# Altium footprint library Connectors THD.PcbLib: 631 footprints (part 14 of 46) (continued)
## FCI_HM2P07PDG1A1N9LF [mm] "110+44 Contacts, 22 positions  in Two Parts x 5 Rows  (a,b,c,d,e) + 2  Rows (z,f), Pitch 2 mm,  Press-Fit, Straight Hard Metric Male Connector, Millipacs, Type A"
height 13.6
pads (155):
  round 1.1 hole 0.6: a1(-4,24) a2(-4,22) a3(-4,20) a4(-4,18) a5(-4,16) a6(-4,14) a7(-4,12) a8(-4,10) a9(-4,8) a10(-4,6) a11(-4,4) a15(-4,-4) a16(-4,-6) a17(-4,-8) a18(-4,-10) a19(-4,-12) a20(-4,-14) a21(-4,-16) a22(-4,-18) a23(-4,-20) a24(-4,-22) a25(-4,-24) b1(-2,24) b2(-2,22) b3(-2,20) b4(-2,18) b5(-2,16) b6(-2,14) b7(-2,12) b8(-2,10) b9(-2,8) b10(-2,6) b11(-2,4) b15(-2,-4) b16(-2,-6) b17(-2,-8) b18(-2,-10) b19(-2,-12) b20(-2,-14) b21(-2,-16) b22(-2,-18) b23(-2,-20) b24(-2,-22) b25(-2,-24) c1(0,24) c2(0,22) c3(0,20) c4(0,18) c5(0,16) c6(0,14) c7(0,12) c8(0,10) c9(0,8) c10(0,6) c11(0,4) c15(0,-4) c16(0,-6) c17(0,-8) c18(0,-10) c19(0,-12) c20(0,-14) c21(0,-16) c22(0,-18) c23(0,-20) c24(0,-22) c25(0,-24) d1(2,24) d2(2,22) d3(2,20) d4(2,18) d5(2,16) d6(2,14) d7(2,12) d8(2,10) d9(2,8) d10(2,6) d11(2,4) d15(2,-4) d16(2,-6) d17(2,-8) d18(2,-10) d19(2,-12) d20(2,-14) d21(2,-16) d22(2,-18) d23(2,-20) d24(2,-22) d25(2,-24) e1(4,24) e2(4,22) e3(4,20) e4(4,18) e5(4,16) e6(4,14) e7(4,12) e8(4,10) e9(4,8) e10(4,6) e11(4,4) e15(4,-4) e16(4,-6) e17(4,-8) e18(4,-10) e19(4,-12) e20(4,-14) e21(4,-16) e22(4,-18) e23(4,-20) e24(4,-22) e25(4,-24) f1(6,24) f2(6,22) f3(6,20) f4(6,18) f5(6,16) f6(6,14) f7(6,12) f8(6,10) f9(6,8) f10(6,6) f11(6,4) f15(6,-4) f16(6,-6) f17(6,-8) f18(6,-10) f19(6,-12) f20(6,-14) f21(6,-16) f22(6,-18) f23(6,-20) f24(6,-22) f25(6,-24) z1(-6,24) z2(-6,22) z3(-6,20) z4(-6,18) z5(-6,16) z6(-6,14) z7(-6,12) z8(-6,10) z9(-6,8) z10(-6,6) z11(-6,4) z15(-6,-4) z16(-6,-6) z17(-6,-8) z18(-6,-10) z19(-6,-12) z20(-6,-14) z21(-6,-16) z22(-6,-18) z23(-6,-20) z24(-6,-21.998) z25(-6,-24)
  round 1 hole 2 unplated mask+0.6: MECH1(2,0)
Top Overlay:
  lines w0.2: -7.25,-25.4 -7.25,24.5 ; -6.9,24.55 -6.9,-25.4 ; -5.85,-3 -3.6,-3 -3.6,-2.9 ; -5.85,3 -3.6,3 -3.6,2.9 ; -3.6,-1.9 -2.25,-1.9 -2.25,-2.9 ; -3.6,1.9 -2.25,1.9 -2.25,2.9 ; 2.25,-2.9 2.25,-1.9 3.6,-1.9 ; 2.25,2.9 2.25,1.9 3.6,1.9 ; 5.85,-3 3.6,-3 3.6,-2.9 ; 5.85,3 3.6,3 3.6,2.9 ; 7.25,-25.4 7.25,24.5 ; -6.9,-25.4 -7.7,-25.4 -7.7,24.5 -6.95,24.5 -6.45,25 6.45,25 6.95,24.5 ; -6.9,-25.4 -6.5,-25 6.55,-25 6.95,-25.4 ; -3.6,-2.9 3.6,-2.9 ; -3.6,-2.9 -3.6,-1.731 -3.95,-1.125 -3.95,1.125 -3.6,1.731 -3.6,2.9 ; -3.6,2.9 3.6,2.9 ; 3.6,-2.9 3.6,-1.9 ; 3.6,-1.9 3.6,-1.731 3.95,-1.125 3.95,1.125 3.6,1.731 3.6,2.9 ; 6.95,-25.4 7.7,-25.4 7.7,24.5 6.95,24.5 ; 6.95,-25.4 6.95,24.5 ; -6.2,-1.9 -6.2,1.9 -4.475,1.9 -4.475,-1.9 -6.2,-1.9 ; 4.475,-1.9 4.475,1.9 6.2,1.9 6.2,-1.9 4.475,-1.9
  text "25" at -10.1,-24.661 h1.2
  text "a" at -4.333,25.517 h1.5
  text "b" at -2.333,25.5 h1.5
  text "c" at -0.333,25.517 h1.5
  text "d" at 1.667,25.5 h1.5
  text "e" at 3.692,25.517 h1.5
  text "f" at 5.637,25.5 h1.5
  text "z" at -6.363,25.525 h1.5
  text "11" at -9.525,3.342 h1.2
  text "1" at -8.45,23.475 h1.2
  text "22" at -10.1,-18.661 h1.2
  text "15" at -9.925,-4.558 h1.2
Mechanical 8:
  drawing of 624 lines, arcs and shapes, not listed
Mechanical 14:
  drawing of 798 lines, arcs and shapes, not listed
  text "25" at -10.1,-24.661 h1.2
  text "a" at -4.333,25.517 h1.5
  text "b" at -2.333,25.5 h1.5
  text "c" at -0.333,25.517 h1.5
  text "d" at 1.667,25.5 h1.5
  text "e" at 3.692,25.517 h1.5
  text "f" at 5.637,25.5 h1.5
  text "z" at -6.363,25.525 h1.5
  text "1" at -8.45,23.475 h1.2
  text "11" at -9.525,3.342 h1.2
  text "22" at -10.1,-18.661 h1.2
  text "15" at -9.925,-4.558 h1.2
Drill Drawing:
  lines w0.1: -6.9,-18.7 -6.9,-25 6.9,-25 6.9,-3 0,-3 0,3 6.9,3 6.9,25 -6.9,25 -6.9,19.6
  text "PRESS-FIT TECHNOLOGY diam. 0.6mm +0.05 -0" at -7.3,-17.975 h1
3D body: height 13.45, standoff -3.3, extent -7.7,-25.4 7.7,25

## FCI_HM2P70PDE121N9LF [mm] "110+44 Contacts, 22 positions x 5 Rows  (a,b,c,d,e) + 2  Rows (z,f), Pitch 2 mm,  Press-Fit, Straight Hard Metric Male Connector, Millipacs, Type B22"
height 13.6
pads (154):
  round 1.1 hole 0.6: a1(-4,21) a2(-4,19) a3(-4,17) a4(-4,15) a5(-4,13) a6(-4,11) a7(-4,9) a8(-4,7) a9(-4,5) a10(-4,3) a11(-4,1) a12(-4,-1) a13(-4,-3) a14(-4,-5) a15(-4,-7) a16(-4,-9) a17(-4,-11) a18(-4,-13) a19(-4,-15) a20(-4,-17) a21(-4,-19) a22(-4,-21) b1(-2,21) b2(-2,19) b3(-2,17) b4(-2,15) b5(-2,13) b6(-2,11) b7(-2,9) b8(-2,7) b9(-2,5) b10(-2,3) b11(-2,1) b12(-2,-1) b13(-2,-3) b14(-2,-5) b15(-2,-7) b16(-2,-9) b17(-2,-11) b18(-2,-13) b19(-2,-15) b20(-2,-17) b21(-2,-19) b22(-2,-21) c1(0,21) c2(0,19) c3(0,17) c4(0,15) c5(0,13) c6(0,11) c7(0,9) c8(0,7) c9(0,5) c10(0,3) c11(0,1) c12(0,-1) c13(0,-3) c14(0,-5) c15(0,-7) c16(0,-9) c17(0,-11) c18(0,-13) c19(0,-15) c20(0,-17) c21(0,-19) c22(0,-21) d1(2,21) d2(2,19) d3(2,17) d4(2,15) d5(2,13) d6(2,11) d7(2,9) d8(2,7) d9(2,5) d10(2,3) d11(2,1) d12(2,-1) d13(2,-3) d14(2,-5) d15(2,-7) d16(2,-9) d17(2,-11) d18(2,-13) d19(2,-15) d20(2,-17) d21(2,-19) d22(2,-21) e1(4,21) e2(4,19) e3(4,17) e4(4,15) e5(4,13) e6(4,11) e7(4,9) e8(4,7) e9(4,5) e10(4,3) e11(4,1) e12(4,-1) e13(4,-3) e14(4,-5) e15(4,-7) e16(4,-9) e17(4,-11) e18(4,-13) e19(4,-15) e20(4,-17) e21(4,-19) e22(4,-21) f1(6,21) f2(6,19) f3(6,17) f4(6,15) f5(6,13) f6(6,11) f7(6,9) f8(6,7) f9(6,5) f10(6,3) f11(6,1) f12(6,-0.998) f13(6,-3) f14(6,-4.998) f15(6,-7) f16(6,-9) f17(6,-11) f18(6,-13) f19(6,-15) f20(6,-17) f21(6,-19) f22(6,-21) z1(-6,21) z2(-6,19) z3(-6,17) z4(-6,15) z5(-6,13) z6(-6,11) z7(-6,9) z8(-6,7) z9(-6,5) z10(-6,3) z11(-6,1) z12(-6,-1) z13(-6,-3) z14(-6,-5) z15(-6,-7) z16(-6,-9) z17(-6,-11) z18(-6,-13) z19(-6,-15) z20(-6,-17) z21(-6,-19) z22(-6,-21)
Top Overlay:
  lines w0.2: -7.25,-22.4 -7.25,21.5 ; -6.95,-22.4 -6.95,21.5 ; -6.9,21.55 -6.9,-22.4 ; 6.9,21.55 6.9,-22.4 ; 6.95,-22.4 6.95,21.5 ; 7.25,-22.4 7.25,21.5 ; -6.95,21.5 -6.45,22 6.45,22 6.95,21.5 ; -6.95,21.5 -7.7,21.5 -7.7,-22.4 -6.9,-22.4 ; -6.9,-22.4 -6.5,-22 6.5,-22 6.9,-22.4 ; 6.9,-22.4 7.7,-22.4 7.7,21.5 6.95,21.5
  text "15" at -9.925,-7.558 h1.2
  text "22" at -10.1,-21.661 h1.2
  text "1" at -8.45,20.475 h1.2
  text "11" at -9.525,0.342 h1.2
  text "z" at -6.363,22.525 h1.5
  text "f" at 5.637,22.5 h1.5
  text "e" at 3.667,22.517 h1.5
  text "d" at 1.667,22.5 h1.5
  text "c" at -0.333,22.517 h1.5
  text "b" at -2.333,22.5 h1.5
  text "a" at -4.333,22.517 h1.5
Mechanical 8:
  drawing of 620 lines, arcs and shapes, not listed
Mechanical 14:
  drawing of 760 lines, arcs and shapes, not listed
  text "15" at -9.925,-7.558 h1.2
  text "22" at -10.1,-21.661 h1.2
  text "11" at -9.525,0.342 h1.2
  text "1" at -8.45,20.475 h1.2
  text "z" at -6.363,22.525 h1.5
  text "f" at 5.637,22.5 h1.5
  text "e" at 3.667,22.517 h1.5
  text "d" at 1.667,22.5 h1.5
  text "c" at -0.333,22.517 h1.5
  text "b" at -2.333,22.5 h1.5
  text "a" at -4.333,22.517 h1.5
Drill Drawing:
  lines w0.1: -6.9,-18.7 -6.9,-22 6.9,-22 6.9,22 -6.9,22 -6.9,19.7
  text "PRESS-FIT TECHNOLOGY diam. 0.6mm +0.05 -0" at -7.2,-17.775 h1
3D body: height 13.45, standoff -3.3, extent -7.7,-22.4 7.7,22

## FCI_HM2R01PA5108N9LF [mm] "110+13 Contacts, 22 positions x 5 Rows (a,b,c,d,e) in Two Part + Shield  Row (f) 13 Positions, Pitch 2 mm,  Press-Fit, Right Angle Hard Metric Female Connector, Millipacs, Type A"
height 12.25
pads (125):
  round 1.1 hole 0.6: a1(5,24) a2(5,22) a3(5,20) a4(5,18) a5(5,16) a6(5,14) a7(5,12) a8(5,10) a9(5,8) a10(5,6) a11(5,4) a15(5,-4) a16(5,-6) a17(5,-8) a18(5,-10) a19(5,-12) a20(5,-14) a21(5,-16) a22(5,-18) a23(5,-20) a24(5,-22) a25(5,-24) b1(3,24) b2(3,22) b3(3,20) b4(3,18) b5(3,16) b6(3,14) b7(3,12) b8(3,10) b9(3,8) b10(3,6) b11(3,4) b15(3,-4) b16(3,-6) b17(3,-8) b18(3,-10) b19(3,-12) b20(3,-14) b21(3,-16) b22(3,-18) b23(3,-20) b24(3,-22) b25(3,-24) c1(1,24) c2(1,22) c3(1,20) c4(1,18) c5(1,16) c6(1,14) c7(1,12) c8(1,10) c9(1,8) c10(1,6) c11(1,4) c15(1,-4) c16(1,-6) c17(1,-8) c18(1,-10) c19(1,-12) c20(1,-14) c21(1,-16) c22(1,-18) c23(1,-20) c24(1,-22) c25(1,-24) d1(-1,24) d2(-1,22) d3(-1,20) d4(-1,18) d5(-1,16) d6(-1,14) d7(-1,12) d8(-1,10) d9(-1,8) d10(-1,6) d11(-1,4) d15(-1,-4) d16(-1,-6) d17(-1,-8) d18(-1,-10) d19(-1,-12) d20(-1,-14) d21(-1,-16) d22(-1,-18) d23(-1,-20) d24(-1,-22) d25(-1,-24) e1(-3,24) e2(-3,22) e3(-3,20) e4(-3,18) e5(-3,16) e6(-3,14) e7(-3,12) e8(-3,10) e9(-3,8) e10(-3,6) e11(-3,4) e15(-3,-4) e16(-3,-6) e17(-3,-8) e18(-3,-10) e19(-3,-12) e20(-3,-14) e21(-3,-16) e22(-3,-18) e23(-3,-20) e24(-3,-22) e25(-3,-24) f1(-5,24) f3(-5,20) f5(-5,16) f7(-5,12) f9(-5,8) f11(-5,4) f13(-5,0) f15(-5,-4) f17(-5,-8) f19(-5,-12) f21(-5,-16) f23(-5,-20) f25(-5,-24)
  round 1 hole 2 unplated mask+0.6: MECH1(-3,0) MECH2(3,0)
Top Overlay:
  lines w0.2: -5.15,-25 15.8,-25 15.8,-1.825 ; -5.15,-23 -5.15,-21 ; -5.15,-19 -5.15,-17 ; -5.15,-15 -5.15,-13 ; -5.15,-11 -5.15,-9 ; -5.15,-7 -5.15,-5 ; -5.15,-3 -5.15,-1 ; -5.15,1 -5.15,3 ; -5.15,5 -5.15,7 ; -5.15,9 -5.15,11 ; -5.15,13 -5.15,15 ; -5.15,17 -5.15,19 ; -5.15,21 -5.15,23 ; -5.15,25 15.8,25 15.8,1.825 ; 8,-2.464 15.8,-2.464 ; 8,-1.824 17.4,-1.825 18.65,-0.575 18.65,0.575 17.4,1.825 8,1.825 ; 8,2.464 15.8,2.464 ; 15.1,-25 15.1,-3.05 ; 15.1,-23.45 9.65,-23.45 9.65,-22.55 15.1,-22.55 ; 15.1,-21.45 9.65,-21.45 9.65,-20.55 15.1,-20.55 ; 15.1,-19.45 9.65,-19.45 9.65,-18.55 15.1,-18.55 ; 15.1,-17.45 9.65,-17.45 9.65,-16.55 15.1,-16.55 ; 15.1,-15.45 9.65,-15.45 9.65,-14.55 15.1,-14.55 ; 15.1,-13.45 9.65,-13.45 9.65,-12.55 15.1,-12.55 ; 15.1,-11.45 9.65,-11.45 9.65,-10.55 15.1,-10.55 ; 15.1,-9.45 9.65,-9.45 9.65,-8.55 15.1,-8.55 ; 15.1,-7.45 9.65,-7.45 9.65,-6.55 15.1,-6.55 ; 15.1,-5.45 9.65,-5.45 9.65,-4.55 15.1,-4.55 ; 15.1,3.05 15.1,25 ; 15.1,4.55 9.65,4.55 9.65,5.45 15.1,5.45 ; 15.1,6.55 9.65,6.55 9.65,7.45 15.1,7.45 ; 15.1,8.55 9.65,8.55 9.65,9.45 15.1,9.45 ; 15.1,10.55 9.65,10.55 9.65,11.45 15.1,11.45 ; 15.1,12.55 9.65,12.55 9.65,13.45 15.1,13.45 ; 15.1,14.55 9.65,14.55 9.65,15.45 15.1,15.45 ; 15.1,16.55 9.65,16.55 9.65,17.45 15.1,17.45 ; 15.1,18.55 9.65,18.55 9.65,19.45 15.1,19.45 ; 15.1,20.55 9.65,20.55 9.65,21.45 15.1,21.45 ; 15.1,22.55 9.65,22.55 9.65,23.45 15.1,23.45 ; 15.8,-3.05 8,-3.05 8,3.05 15.8,3.05 ; 17.325,-1.825 17.325,1.825 ; 17.75,-1.5 19,-0.25 19,0.25 17.75,1.5
  text "a" at 4.667,25.492 h1.5
  text "e" at -3.333,25.542 h1.5
  text "d" at -1.333,25.5 h1.5
  text "c" at 0.692,25.492 h1.5
  text "b" at 2.667,25.5 h1.5
  text "f" at -5.363,25.5 h1.5
  text "1" at -5.975,23.8 h1.2
  text "11" at -5.975,3.217 h1.2
  text "20" at -5.975,-14.783 h1.2
  text "25" at -5.975,-24.783 h1.2
Mechanical 8:
  drawing of 506 lines, arcs and shapes, not listed
Mechanical 14:
  lines w0.1: 8,-2.464 15.8,-2.464 ; 8,-1.824 17.4,-1.825 18.65,-0.575 18.65,0.575 17.4,1.825 8,1.825 ; 8,2.464 15.8,2.464 ; 15.1,-25 15.1,-3.05 ; 15.1,-23.45 9.65,-23.45 9.65,-22.55 15.1,-22.55 ; 15.1,-21.45 9.65,-21.45 9.65,-20.55 15.1,-20.55 ; 15.1,-19.45 9.65,-19.45 9.65,-18.55 15.1,-18.55 ; 15.1,-17.45 9.65,-17.45 9.65,-16.55 15.1,-16.55 ; 15.1,-15.45 9.65,-15.45 9.65,-14.55 15.1,-14.55 ; 15.1,-13.45 9.65,-13.45 9.65,-12.55 15.1,-12.55 ; 15.1,-11.45 9.65,-11.45 9.65,-10.55 15.1,-10.55 ; 15.1,-9.45 9.65,-9.45 9.65,-8.55 15.1,-8.55 ; 15.1,-7.45 9.65,-7.45 9.65,-6.55 15.1,-6.55 ; 15.1,-5.45 9.65,-5.45 9.65,-4.55 15.1,-4.55 ; 15.1,3.05 15.1,25 ; 15.1,4.55 9.65,4.55 9.65,5.45 15.1,5.45 ; 15.1,6.55 9.65,6.55 9.65,7.45 15.1,7.45 ; 15.1,8.55 9.65,8.55 9.65,9.45 15.1,9.45 ; 15.1,10.55 9.65,10.55 9.65,11.45 15.1,11.45 ; 15.1,12.55 9.65,12.55 9.65,13.45 15.1,13.45 ; 15.1,14.55 9.65,14.55 9.65,15.45 15.1,15.45 ; 15.1,16.55 9.65,16.55 9.65,17.45 15.1,17.45 ; 15.1,18.55 9.65,18.55 9.65,19.45 15.1,19.45 ; 15.1,20.55 9.65,20.55 9.65,21.45 15.1,21.45 ; 15.1,22.55 9.65,22.55 9.65,23.45 15.1,23.45 ; 15.8,-3.05 8,-3.05 8,3.05 15.8,3.05 ; 15.8,-1.825 15.8,-25 -5.15,-25 -5.15,25 15.8,25 15.8,1.825 ; 17.325,-1.825 17.325,1.825 ; 17.75,-1.5 19,-0.25 19,0.25 17.75,1.5
  text "a" at 4.667,25.492 h1.5
  text "b" at 2.667,25.5 h1.5
  text "c" at 0.692,25.492 h1.5
  text "d" at -1.333,25.5 h1.5
  text "e" at -3.333,25.542 h1.5
  text "f" at -5.363,25.5 h1.5
  text "25" at -5.975,-24.783 h1.2
  text "20" at -5.975,-14.783 h1.2
  text "11" at -5.975,3.217 h1.2
  text "1" at -5.975,23.8 h1.2
Drill Drawing:
  lines w0.1: -6.25,-18.7 -6.25,-25 6.15,-25 6.15,-2.475 -5.15,-2.475 -5.15,2.475 6.15,2.475 6.15,25 -6.25,25 -6.25,19.6
  text "PRESS-FIT TECHNOLOGY diam. 0.6mm +0.05 -0" at -6.1,-17.85 h1
3D body: height 8.13, standoff -4.13, extent -5.15,-25 19,25

## FCI_HM2R70PA5108N9LF [mm] "110+11 Contacts, 22 positions x 5 Rows  (a,b,c,d,e) +  Shield  Row (f) 11 Positions, Pitch 2 mm,  Press-Fit, Right Angle Hard Metric Female Connector, Millipacs, Type B22"
height 11.4
pads (121):
  round 1.1 hole 0.6: a1(4,21) a2(4,19) a3(4,17) a4(4,15) a5(4,13) a6(4,11) a7(4,9) a8(4,7) a9(4,5) a10(4,3) a11(4,1) a12(4,-1) a13(4,-3) a14(4,-5) a15(4,-7) a16(4,-9) a17(4,-11) a18(4,-13) a19(4,-15) a20(4,-17) a21(4,-19) a22(4,-21) b1(2,21) b2(2,19) b3(2,17) b4(2,15) b5(2,13) b6(2,11) b7(2,9) b8(2,7) b9(2,5) b10(2,3) b11(2,1) b12(2,-1) b13(2,-3) b14(2,-5) b15(2,-7) b16(2,-9) b17(2,-11) b18(2,-13) b19(2,-15) b20(2,-17) b21(2,-19) b22(2,-21) c1(0,21) c2(0,19) c3(0,17) c4(0,15) c5(0,13) c6(0,11) c7(0,9) c8(0,7) c9(0,5) c10(0,3) c11(0,1) c12(0,-1) c13(0,-3) c14(0,-5) c15(0,-7) c16(0,-9) c17(0,-11) c18(0,-13) c19(0,-15) c20(0,-17) c21(0,-19) c22(0,-21) d1(-2,21) d2(-2,19) d3(-2,17) d4(-2,15) d5(-2,13) d6(-2,11) d7(-2,9) d8(-2,7) d9(-2,5) d10(-2,3) d11(-2,1) d12(-2,-1) d13(-2,-3) d14(-2,-5) d15(-2,-7) d16(-2,-9) d17(-2,-11) d18(-2,-13) d19(-2,-15) d20(-2,-17) d21(-2,-19) d22(-2,-21) e1(-4,21) e2(-4,19) e3(-4,17) e4(-4,15) e5(-4,13) e6(-4,11) e7(-4,9) e8(-4,7) e9(-4,5) e10(-4,3) e11(-4,1) e12(-4,-1) e13(-4,-3) e14(-4,-5) e15(-4,-7) e16(-4,-9) e17(-4,-11) e18(-4,-13) e19(-4,-15) e20(-4,-17) e21(-4,-19) e22(-4,-21) f1(-6,21) f3(-6,17) f5(-6,13) f7(-6,9) f9(-6,5) f11(-6,1) f13(-6,-3) f15(-6,-7) f17(-6,-11) f19(-6,-15) f21(-6,-19)
Top Overlay:
  lines w0.2: -6.15,-20 -6.15,-22 14.8,-22 14.8,22 -6.15,22 ; -6.15,-18.002 -6.15,-16.002 ; -6.15,-14.002 -6.15,-12.002 ; -6.15,-10.002 -6.15,-8.002 ; -6.15,-6.002 -6.15,-4.002 ; -6.15,-2.002 -6.15,-0.002 ; -6.15,1.998 -6.15,3.998 ; -6.15,5.998 -6.15,7.998 ; -6.15,9.998 -6.15,11.998 ; -6.15,13.998 -6.15,15.998 ; -6.15,17.998 -6.15,19.998 ; 7,-22 7,22 ; 14.1,-22 14.1,22 ; 14.1,-20.45 8.65,-20.45 8.65,-19.55 14.1,-19.55 ; 14.1,-18.45 8.65,-18.45 8.65,-17.55 14.1,-17.55 ; 14.1,-16.45 8.65,-16.45 8.65,-15.55 14.1,-15.55 ; 14.1,-14.45 8.65,-14.45 8.65,-13.55 14.1,-13.55 ; 14.1,-12.45 8.65,-12.45 8.65,-11.55 14.1,-11.55 ; 14.1,-10.45 8.65,-10.45 8.65,-9.55 14.1,-9.55 ; 14.1,-8.45 8.65,-8.45 8.65,-7.55 14.1,-7.55 ; 14.1,-6.45 8.65,-6.45 8.65,-5.55 14.1,-5.55 ; 14.1,-4.45 8.65,-4.45 8.65,-3.55 14.1,-3.55 ; 14.1,-2.45 8.65,-2.45 8.65,-1.55 14.1,-1.55 ; 14.1,-0.45 8.65,-0.45 8.65,0.45 14.1,0.45 ; 14.1,1.55 8.65,1.55 8.65,2.45 14.1,2.45 ; 14.1,3.55 8.65,3.55 8.65,4.45 14.1,4.45 ; 14.1,5.55 8.65,5.55 8.65,6.45 14.1,6.45 ; 14.1,7.55 8.65,7.55 8.65,8.45 14.1,8.45 ; 14.1,9.55 8.65,9.55 8.65,10.45 14.1,10.45 ; 14.1,11.55 8.65,11.55 8.65,12.45 14.1,12.45 ; 14.1,13.55 8.65,13.55 8.65,14.45 14.1,14.45 ; 14.1,15.55 8.65,15.55 8.65,16.45 14.1,16.45 ; 14.1,17.55 8.65,17.55 8.65,18.45 14.1,18.45 ; 14.1,19.55 8.65,19.55 8.65,20.45 14.1,20.45
  text "11" at -6.975,0.217 h1.2
  text "1" at -6.975,20.8 h1.2
  text "f" at -6.363,22.5 h1.5
  text "b" at 1.667,22.5 h1.5
  text "c" at -0.333,22.667 h1.5
  text "d" at -2.333,22.5 h1.5
  text "e" at -4.333,22.667 h1.5
  text "a" at 3.592,22.517 h1.5
  text "22" at -6.975,-21.786 h1.2
  text "15" at -6.975,-7.783 h1.2
Mechanical 8:
  drawing of 490 lines, arcs and shapes, not listed
Mechanical 14:
  lines w0.1: -6.15,-22 14.8,-22 14.8,22 -6.15,22 ; 7,-22 7,22 ; 14.1,-22 14.1,22 ; 14.1,-20.45 8.65,-20.45 8.65,-19.55 14.1,-19.55 ; 14.1,-18.45 8.65,-18.45 8.65,-17.55 14.1,-17.55 ; 14.1,-16.45 8.65,-16.45 8.65,-15.55 14.1,-15.55 ; 14.1,-14.45 8.65,-14.45 8.65,-13.55 14.1,-13.55 ; 14.1,-12.45 8.65,-12.45 8.65,-11.55 14.1,-11.55 ; 14.1,-10.45 8.65,-10.45 8.65,-9.55 14.1,-9.55 ; 14.1,-8.45 8.65,-8.45 8.65,-7.55 14.1,-7.55 ; 14.1,-6.45 8.65,-6.45 8.65,-5.55 14.1,-5.55 ; 14.1,-4.45 8.65,-4.45 8.65,-3.55 14.1,-3.55 ; 14.1,-2.45 8.65,-2.45 8.65,-1.55 14.1,-1.55 ; 14.1,-0.45 8.65,-0.45 8.65,0.45 14.1,0.45 ; 14.1,1.55 8.65,1.55 8.65,2.45 14.1,2.45 ; 14.1,3.55 8.65,3.55 8.65,4.45 14.1,4.45 ; 14.1,5.55 8.65,5.55 8.65,6.45 14.1,6.45 ; 14.1,7.55 8.65,7.55 8.65,8.45 14.1,8.45 ; 14.1,9.55 8.65,9.55 8.65,10.45 14.1,10.45 ; 14.1,11.55 8.65,11.55 8.65,12.45 14.1,12.45 ; 14.1,13.55 8.65,13.55 8.65,14.45 14.1,14.45 ; 14.1,15.55 8.65,15.55 8.65,16.45 14.1,16.45 ; 14.1,17.55 8.65,17.55 8.65,18.45 14.1,18.45 ; 14.1,19.55 8.65,19.55 8.65,20.45 14.1,20.45
  text "1" at -6.975,20.8 h1.2
  text "11" at -6.975,0.217 h1.2
  text "f" at -6.363,22.5 h1.5
  text "e" at -4.333,22.667 h1.5
  text "d" at -2.333,22.5 h1.5
  text "c" at -0.333,22.667 h1.5
  text "b" at 1.667,22.5 h1.5
  text "a" at 3.592,22.517 h1.5
  text "22" at -6.975,-21.786 h1.2
  text "15" at -6.975,-7.783 h1.2
Drill Drawing:
  lines w0.1: -6.975,-19.3 -6.975,-22 5.225,-22 5.225,22 -6.975,22 -6.975,19.075
  text "PRESS-FIT TECHNOLOGY diam. 0.6mm +0.05 -0" at -7.25,-18.175 h1
3D body: height 7.7, standoff -3.7, extent -6.15,-22 14.8,22

## FCT_271680210 [mm] "DIN 41612, Type M, 16 Contacts (Row ac) + 8 Spares  Positions for Specials Contacts, Straight Female Connector, Pitch 2.54 mm"
height 12.6
pads (18):
  round 1.7 hole 1: a13(0,-30.48) a14(0,-33.02) a15(0,-35.56) a16(0,-38.1) a17(0,-40.64) a18(0,-43.18) a19(0,-45.72) a20(0,-48.26) c13(5.08,-30.48) c14(5.08,-33.02) c15(5.08,-35.56) c16(5.08,-38.1) c17(5.08,-40.64) c18(5.08,-43.18) c19(5.08,-45.72) c20(5.08,-48.26)
  round 3.5 / inner round 3.5 / far side round 5.1 hole 2.8: MTG1(2.24,5.63) MTG2(2.24,-84.37)
Top Overlay:
  lines w0.2: -1.651,-81.811 -1.11,-81.27 ; -1.651,3.071 -1.11,2.53 ; -1.11,-79.99 -1.11,-81.27 ; -1.11,1.25 -1.11,2.53 ; -0.76,-86.866 -0.76,-82.87 cw(c0.24,-82.87) 0.24,-81.87 1.22,-81.87 -1.71,-81.87 -1.71,3.13 1.22,3.13 0.24,3.13 cw(c0.24,4.13) -0.76,4.13 -0.76,8.13 ; 1.22,-86.87 -2.76,-86.87 -2.76,8.13 1.22,8.13 ; 3.26,-86.87 7.84,-86.87 7.84,8.13 3.26,8.13 ; 3.79,-81.27 -1.11,-81.27 ; 3.79,2.53 -1.11,2.53 ; 5.24,-86.863 5.24,-82.87 ccw(c4.24,-82.87) 4.24,-81.87 3.26,-81.87 3.79,-81.87 3.79,-80.87 ; 5.24,8.13 5.24,4.13 cw(c4.24,4.13) 4.24,3.13 3.26,3.13 3.79,3.13 3.79,2.13 ; 6.04,-80.87 6.042,-79.99 ; 6.04,-80.27 3.79,-80.27 3.79,-80.87 ; 6.189,1.25 6.19,1.53 ; 6.731,2.071 6.19,1.53 ; 3.79,-80.87 6.79,-80.87 6.79,2.13 3.79,2.13 ; 3.79,2.13 3.79,1.53 6.19,1.53
  text "20" at -5.345,-48.8 h1.2
  text "13" at -5.14,-31.055 h1.2
  text "c" at 5.88,2.71 h1.2
  text "a" at -0.526,1.135 h1.2
Mechanical 8:
  drawing of 236 lines, arcs and shapes, not listed
Mechanical 14:
  drawing of 395 lines, arcs and shapes, not listed
3D body: height 13.05, standoff -3.55, extent -2.76,-86.87 7.84,8.13

## FCT_271682110 [mm] "DIN 41612, Type M, 16 Contacts (Row ac) + 8 Spares  Positions for Specials Contacts, Right Angle Male Connector, Pitch 2.54 mm"
height 11.1
pads (18):
  round 1.7 hole 1: a13(0,-30.48) a14(0,-33.02) a15(0,-35.56) a16(0,-38.1) a17(0,-40.64) a18(0,-43.18) a19(0,-45.72) a20(0,-48.26) c13(-5.08,-30.48) c14(-5.08,-33.02) c15(-5.08,-35.56) c16(-5.08,-38.1) c17(-5.08,-40.64) c18(-5.08,-43.18) c19(-5.08,-45.72) c20(-5.08,-48.26)
  round 3.5 / inner round 3.5 / far side round 5.1 hole 2.8: MTG1(2.54,5.08) MTG2(2.54,-83.82)
Top Overlay:
  lines w0.2: -1.76,-80.59 -1.76,-81.32 0.04,-81.32 ; -1.76,1.85 -1.76,2.58 0.04,2.58 ; 0.04,-84.84 0.04,-86.37 1.653,-86.37 ; 0.04,-82.8 0.04,-81.32 ; 0.04,4.06 0.04,2.58 ; 0.04,6.1 0.04,7.63 1.653,7.63 ; 1.175,-50.29 1.84,-50.29 1.84,-28.45 1.175,-28.45 ; 1.25,-48.71 1.84,-48.71 ; 1.25,-47.81 1.84,-47.81 ; 1.25,-46.17 1.84,-46.17 ; 1.25,-45.27 1.84,-45.27 ; 1.25,-43.63 1.84,-43.63 ; 1.25,-42.73 1.84,-42.73 ; 1.25,-41.09 1.84,-41.09 ; 1.25,-40.19 1.84,-40.19 ; 1.25,-38.55 1.84,-38.55 ; 1.25,-37.65 1.84,-37.65 ; 1.25,-36.01 1.84,-36.01 ; 1.25,-35.11 1.84,-35.11 ; 1.25,-33.47 1.84,-33.47 ; 1.25,-32.57 1.84,-32.57 ; 1.25,-30.93 1.84,-30.93 ; 1.25,-30.03 1.84,-30.03 ; 1.52,-81.32 0.04,-81.32 ; 1.52,2.58 0.04,2.58 ; 3.427,-86.37 7.54,-86.37 7.54,-83.12 12.74,-83.12 12.74,-65.961 12.14,-65.8 12.14,-61.2 12.74,-61.039 12.74,-50.721 12.14,-50.56 12.14,-45.96 12.74,-45.799 12.74,-32.941 12.14,-32.78 12.14,-28.18 12.74,-28.019 12.74,-17.701 12.14,-17.54 12.14,-12.94 12.74,-12.779 12.74,4.38 7.54,4.38 7.54,7.63 3.427,7.63 ; 3.56,-81.32 4.214,-81.32 5.54,-83.616 5.54,-86.37 ; 3.56,2.58 4.214,2.58 5.54,4.876 5.54,7.63
  text "20" at -8.475,-48.8 h1.2
  text "13" at -8.27,-31.055 h1.2
  text "a" at -0.425,3.252 h1.2
  text "c" at -4.58,3.22 h1.2
Mechanical 8:
  drawing of 241 lines, arcs and shapes, not listed
  text "PCB" at 6.585,-41.2 h1.2
Mechanical 14:
  circle w0.1: c2.54,5.08 r1.275
  circle w0.1: c2.54,-83.82 r1.275
  lines w0.1: 1.84,-48.71 -5.38,-48.71 -5.38,-47.81 1.84,-47.81 ; 1.84,-47.213 1.34,-47.213 1.34,-46.767 1.84,-46.767 ; 1.84,-46.17 -5.38,-46.17 -5.38,-45.27 1.84,-45.27 ; 1.84,-44.673 1.34,-44.673 1.34,-44.227 1.84,-44.227 ; 1.84,-43.63 -5.38,-43.63 -5.38,-42.73 1.84,-42.73 ; 1.84,-42.133 1.34,-42.133 1.34,-41.687 1.84,-41.687 ; 1.84,-41.09 -5.38,-41.09 -5.38,-40.19 1.84,-40.19 ; 1.84,-39.593 1.34,-39.593 1.34,-39.147 1.84,-39.147 ; 1.84,-38.55 -5.38,-38.55 -5.38,-37.65 1.84,-37.65 ; 1.84,-37.053 1.34,-37.053 1.34,-36.607 1.84,-36.607 ; 1.84,-36.01 -5.38,-36.01 -5.38,-35.11 1.84,-35.11 ; 1.84,-34.513 1.34,-34.513 1.34,-34.067 1.84,-34.067 ; 1.84,-33.47 -5.38,-33.47 -5.38,-32.57 1.84,-32.57 ; 1.84,-31.973 1.34,-31.973 1.34,-31.527 1.84,-31.527 ; 1.84,-30.93 -5.38,-30.93 -5.38,-30.03 1.84,-30.03 ; 2.04,-81.32 2.04,2.58 ; 5.54,-86.37 5.54,-83.616 4.214,-81.32 0.04,-81.32 ; 5.54,7.63 5.54,4.876 4.214,2.58 0.04,2.58 ; 0.04,-81.32 -1.76,-81.32 -1.76,-50.29 1.84,-50.29 1.84,-28.45 -1.76,-28.45 -1.76,2.58 0.04,2.58 ; 0.04,-81.32 0.04,-86.37 7.54,-86.37 7.54,-83.12 12.74,-83.12 12.74,-65.961 12.14,-65.8 12.14,-61.2 12.74,-61.039 12.74,-50.721 12.14,-50.56 12.14,-45.96 12.74,-45.799 12.74,-32.941 12.14,-32.78 12.14,-28.18 12.74,-28.019 12.74,-17.701 12.14,-17.54 12.14,-12.94 12.74,-12.779 12.74,4.38 7.54,4.38 7.54,7.63 0.04,7.63 0.04,2.58
3D body: height 9.38, standoff -2.95, extent -5.38,-86.37 12.74,7.63

## FCT_F37P5G2-0997 [mm] "Right Angled D-SUB 37 Male Contacts for PCB  with Harpoons and Female Screwlock (UNC4-40) and Elec. Continuity"
height 13.4
pads (39):
  round 1.6 hole 0.9: 1(24.93,-1.27) 2(22.16,-1.27) 3(19.39,-1.27) 4(16.62,-1.27) 5(13.85,-1.27) 6(11.08,-1.27) 7(8.31,-1.27) 8(5.54,-1.27) 9(2.77,-1.27) 10(0,-1.27) 11(-2.77,-1.27) 12(-5.54,-1.27) 13(-8.31,-1.27) 14(-11.08,-1.27) 15(-13.85,-1.27) 16(-16.62,-1.27) 17(-19.39,-1.27) 18(-22.16,-1.27) 19(-24.93,-1.27) 20(23.56,1.27) 21(20.79,1.27) 22(18.02,1.27) 23(15.25,1.27) 24(12.48,1.27) 25(9.71,1.27) 26(6.94,1.27) 27(4.17,1.27) 28(1.4,1.27) 29(-1.37,1.27) 30(-4.14,1.27) 31(-6.91,1.27) 32(-9.68,1.27) 33(-12.45,1.27) 34(-15.22,1.27) 35(-17.99,1.27) 36(-20.76,1.27) 37(-23.53,1.27)
  round 3.7 hole 3: 38(-31.75,0) 39(31.75,0)
Top Overlay:
  lines w0.2: -34.75,-2.5 -28.75,-2.5 ; -34.75,8.1 -28.85,8.1 ; -34.75,8.5 -28.85,8.5 ; -34.6,10.67 -34.6,11.57 34.6,11.57 34.6,10.67 ; -34.15,8.1 ccw(c-33.75,8.1) -33.75,7.7 -29.75,7.7 ccw(c-29.75,8.1) -29.35,8.1 ; -33.915,11.57 -33.915,17.77 -29.585,17.77 -29.585,11.57 ; -33.754,8.5 -33.754,10.67 ; -31.75,11.6 -31.75,17.77 ; -29.75,8.5 -29.75,10.67 ; -28.85,10.67 -28.85,7.67 ccw(c-28.35,7.67) -28.35,7.17 ; -28.75,7.37 -28.75,-3.9 -34.75,-3.9 -34.75,10.67 ; -28.65,7.17 28.35,7.17 ccw(c28.35,7.67) 28.85,7.67 28.85,10.67 ; -28.001,11.57 -28.001,17.17 cw(c-27.701,17.17) -27.701,17.47 27.702,17.47 cw(c27.702,17.17) 28.002,17.17 28.002,11.57 ; -26.819,7.17 -26.819,6.17 26.82,6.17 26.82,7.17 ; 28.75,-2.5 34.75,-2.5 ; 28.75,7.37 28.75,-3.9 34.75,-3.9 34.75,10.67 ; 28.85,8.1 34.75,8.1 ; 28.85,8.5 34.75,8.5 ; 29.35,8.1 ccw(c29.75,8.1) 29.75,7.7 33.75,7.7 ccw(c33.75,8.1) 34.15,8.1 ; 29.585,11.57 29.585,17.77 33.915,17.77 33.915,11.57 ; 29.75,8.5 29.75,10.67 ; 31.75,11.6 31.75,17.77 ; 33.754,8.5 33.754,10.67 ; -34.75,10.67 34.75,10.67 ; -34.75,10.67 34.75,10.67
  text "37" at -27.197,0.508 h1.2
  text "19" at -28.21,-2 h1.2
  text "1" at 26.181,-2.032 h1.2
  text "20" at 26.181,0.508 h1.2
Mechanical 8:
  drawing of 164 lines, arcs and shapes, not listed
Mechanical 14:
  circle w0.1: c-31.75,0 r1.55
  circle w0.1: c31.75,0 r1.55
  lines w0.1: -34.75,-2.5 -28.75,-2.5 ; -34.75,8.1 -28.85,8.1 ; -34.75,8.5 -28.85,8.5 ; -34.6,10.67 -34.6,11.57 34.6,11.57 34.6,10.67 ; -34.15,8.1 ccw(c-33.75,8.1) -33.75,7.7 -29.75,7.7 ccw(c-29.75,8.1) -29.35,8.1 ; -33.915,11.57 -33.915,17.77 -29.585,17.77 -29.585,11.57 ; -33.754,8.5 -33.754,10.67 ; -31.75,11.6 -31.75,17.77 ; -29.75,8.5 -29.75,10.67 ; -28.85,10.67 -28.85,7.67 ccw(c-28.35,7.67) -28.35,7.17 ; -28.75,7.37 -28.75,-3.9 -34.75,-3.9 -34.75,10.67 ; -28.65,7.17 28.35,7.17 ccw(c28.35,7.67) 28.85,7.67 28.85,10.67 ; -28.001,11.57 -28.001,17.17 cw(c-27.701,17.17) -27.701,17.47 27.702,17.47 cw(c27.702,17.17) 28.002,17.17 28.002,11.57 ; -26.819,7.17 -26.819,6.17 26.82,6.17 26.82,7.17 ; 28.75,-2.5 34.75,-2.5 ; 28.75,7.37 28.75,-3.9 34.75,-3.9 34.75,10.67 ; 28.85,8.1 34.75,8.1 ; 28.85,8.5 34.75,8.5 ; 29.35,8.1 ccw(c29.75,8.1) 29.75,7.7 33.75,7.7 ccw(c33.75,8.1) 34.15,8.1 ; 29.585,11.57 29.585,17.77 33.915,17.77 33.915,11.57 ; 29.75,8.5 29.75,10.67 ; 31.75,11.6 31.75,17.77 ; 33.754,8.5 33.754,10.67 ; -34.75,10.67 34.75,10.67 ; -34.75,10.67 34.75,10.67
3D body: height 13.45, standoff -4.2, extent -34.75,-3.9 34.75,17.77